# Altium schematic symbol library Connector.SchLib: 372 symbols (part 2 of 4) (continued)
## Conn_01x52_Socket (continued)
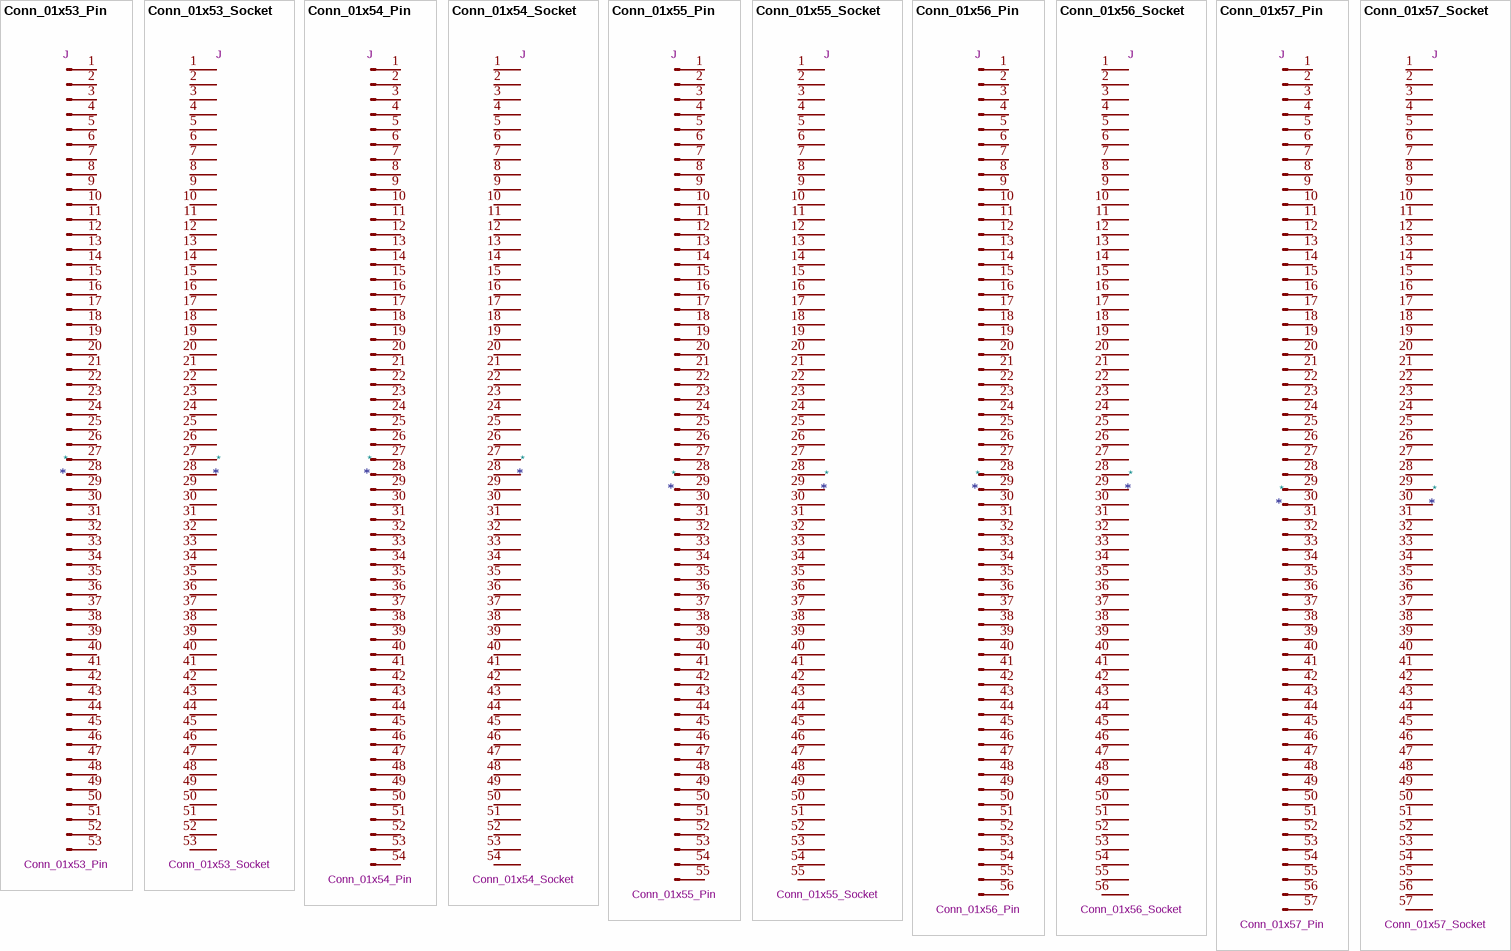
[diagram p7: symbols Conn_01x53_Pin to Conn_01x57_Socket]

## Conn_01x53_Pin
designator *  value Conn_01x53_Pin  Reference: J
ki_keywords: connector; ki_description: "Generic connector, single row, 01x53, script generated"; ki_fp_filters: Connector*:*_1x??_*; Datasheet: ~
pins: 1 Pin_1, 2 Pin_2, 3 Pin_3, 4 Pin_4, 5 Pin_5, 6 Pin_6, 7 Pin_7, 8 Pin_8, 9 Pin_9, 10 Pin_10, 11 Pin_11, 12 Pin_12, 13 Pin_13, 14 Pin_14, 15 Pin_15, 16 Pin_16, 17 Pin_17, 18 Pin_18, 19 Pin_19, 20 Pin_20, 21 Pin_21, 22 Pin_22, 23 Pin_23, 24 Pin_24, 25 Pin_25, 26 Pin_26, 27 Pin_27, 28 Pin_28, 29 Pin_29, 30 Pin_30, 31 Pin_31, 32 Pin_32, 33 Pin_33, 34 Pin_34, 35 Pin_35, 36 Pin_36, 37 Pin_37, 38 Pin_38, 39 Pin_39, 40 Pin_40, 41 Pin_41, 42 Pin_42, 43 Pin_43, 44 Pin_44, 45 Pin_45, 46 Pin_46, 47 Pin_47, 48 Pin_48, 49 Pin_49, 50 Pin_50, 51 Pin_51, 52 Pin_52, 53 Pin_53

## Conn_01x53_Socket
designator *  value Conn_01x53_Socket  Reference: J
ki_keywords: connector; ki_description: "Generic connector, single row, 01x53, script generated"; ki_fp_filters: Connector*:*_1x??_*; Datasheet: ~
pins: 1 Pin_1, 2 Pin_2, 3 Pin_3, 4 Pin_4, 5 Pin_5, 6 Pin_6, 7 Pin_7, 8 Pin_8, 9 Pin_9, 10 Pin_10, 11 Pin_11, 12 Pin_12, 13 Pin_13, 14 Pin_14, 15 Pin_15, 16 Pin_16, 17 Pin_17, 18 Pin_18, 19 Pin_19, 20 Pin_20, 21 Pin_21, 22 Pin_22, 23 Pin_23, 24 Pin_24, 25 Pin_25, 26 Pin_26, 27 Pin_27, 28 Pin_28, 29 Pin_29, 30 Pin_30, 31 Pin_31, 32 Pin_32, 33 Pin_33, 34 Pin_34, 35 Pin_35, 36 Pin_36, 37 Pin_37, 38 Pin_38, 39 Pin_39, 40 Pin_40, 41 Pin_41, 42 Pin_42, 43 Pin_43, 44 Pin_44, 45 Pin_45, 46 Pin_46, 47 Pin_47, 48 Pin_48, 49 Pin_49, 50 Pin_50, 51 Pin_51, 52 Pin_52, 53 Pin_53

## Conn_01x54_Pin
designator *  value Conn_01x54_Pin  Reference: J
ki_keywords: connector; ki_description: "Generic connector, single row, 01x54, script generated"; ki_fp_filters: Connector*:*_1x??_*; Datasheet: ~
pins: 1 Pin_1, 2 Pin_2, 3 Pin_3, 4 Pin_4, 5 Pin_5, 6 Pin_6, 7 Pin_7, 8 Pin_8, 9 Pin_9, 10 Pin_10, 11 Pin_11, 12 Pin_12, 13 Pin_13, 14 Pin_14, 15 Pin_15, 16 Pin_16, 17 Pin_17, 18 Pin_18, 19 Pin_19, 20 Pin_20, 21 Pin_21, 22 Pin_22, 23 Pin_23, 24 Pin_24, 25 Pin_25, 26 Pin_26, 27 Pin_27, 28 Pin_28, 29 Pin_29, 30 Pin_30, 31 Pin_31, 32 Pin_32, 33 Pin_33, 34 Pin_34, 35 Pin_35, 36 Pin_36, 37 Pin_37, 38 Pin_38, 39 Pin_39, 40 Pin_40, 41 Pin_41, 42 Pin_42, 43 Pin_43, 44 Pin_44, 45 Pin_45, 46 Pin_46, 47 Pin_47, 48 Pin_48, 49 Pin_49, 50 Pin_50, 51 Pin_51, 52 Pin_52, 53 Pin_53, 54 Pin_54

## Conn_01x54_Socket
designator *  value Conn_01x54_Socket  Reference: J
ki_keywords: connector; ki_description: "Generic connector, single row, 01x54, script generated"; ki_fp_filters: Connector*:*_1x??_*; Datasheet: ~
pins: 1 Pin_1, 2 Pin_2, 3 Pin_3, 4 Pin_4, 5 Pin_5, 6 Pin_6, 7 Pin_7, 8 Pin_8, 9 Pin_9, 10 Pin_10, 11 Pin_11, 12 Pin_12, 13 Pin_13, 14 Pin_14, 15 Pin_15, 16 Pin_16, 17 Pin_17, 18 Pin_18, 19 Pin_19, 20 Pin_20, 21 Pin_21, 22 Pin_22, 23 Pin_23, 24 Pin_24, 25 Pin_25, 26 Pin_26, 27 Pin_27, 28 Pin_28, 29 Pin_29, 30 Pin_30, 31 Pin_31, 32 Pin_32, 33 Pin_33, 34 Pin_34, 35 Pin_35, 36 Pin_36, 37 Pin_37, 38 Pin_38, 39 Pin_39, 40 Pin_40, 41 Pin_41, 42 Pin_42, 43 Pin_43, 44 Pin_44, 45 Pin_45, 46 Pin_46, 47 Pin_47, 48 Pin_48, 49 Pin_49, 50 Pin_50, 51 Pin_51, 52 Pin_52, 53 Pin_53, 54 Pin_54

## Conn_01x55_Pin
designator *  value Conn_01x55_Pin  Reference: J
ki_keywords: connector; ki_description: "Generic connector, single row, 01x55, script generated"; ki_fp_filters: Connector*:*_1x??_*; Datasheet: ~
pins: 1 Pin_1, 2 Pin_2, 3 Pin_3, 4 Pin_4, 5 Pin_5, 6 Pin_6, 7 Pin_7, 8 Pin_8, 9 Pin_9, 10 Pin_10, 11 Pin_11, 12 Pin_12, 13 Pin_13, 14 Pin_14, 15 Pin_15, 16 Pin_16, 17 Pin_17, 18 Pin_18, 19 Pin_19, 20 Pin_20, 21 Pin_21, 22 Pin_22, 23 Pin_23, 24 Pin_24, 25 Pin_25, 26 Pin_26, 27 Pin_27, 28 Pin_28, 29 Pin_29, 30 Pin_30, 31 Pin_31, 32 Pin_32, 33 Pin_33, 34 Pin_34, 35 Pin_35, 36 Pin_36, 37 Pin_37, 38 Pin_38, 39 Pin_39, 40 Pin_40, 41 Pin_41, 42 Pin_42, 43 Pin_43, 44 Pin_44, 45 Pin_45, 46 Pin_46, 47 Pin_47, 48 Pin_48, 49 Pin_49, 50 Pin_50, 51 Pin_51, 52 Pin_52, 53 Pin_53, 54 Pin_54, 55 Pin_55

## Conn_01x55_Socket
designator *  value Conn_01x55_Socket  Reference: J
ki_keywords: connector; ki_description: "Generic connector, single row, 01x55, script generated"; ki_fp_filters: Connector*:*_1x??_*; Datasheet: ~
pins: 1 Pin_1, 2 Pin_2, 3 Pin_3, 4 Pin_4, 5 Pin_5, 6 Pin_6, 7 Pin_7, 8 Pin_8, 9 Pin_9, 10 Pin_10, 11 Pin_11, 12 Pin_12, 13 Pin_13, 14 Pin_14, 15 Pin_15, 16 Pin_16, 17 Pin_17, 18 Pin_18, 19 Pin_19, 20 Pin_20, 21 Pin_21, 22 Pin_22, 23 Pin_23, 24 Pin_24, 25 Pin_25, 26 Pin_26, 27 Pin_27, 28 Pin_28, 29 Pin_29, 30 Pin_30, 31 Pin_31, 32 Pin_32, 33 Pin_33, 34 Pin_34, 35 Pin_35, 36 Pin_36, 37 Pin_37, 38 Pin_38, 39 Pin_39, 40 Pin_40, 41 Pin_41, 42 Pin_42, 43 Pin_43, 44 Pin_44, 45 Pin_45, 46 Pin_46, 47 Pin_47, 48 Pin_48, 49 Pin_49, 50 Pin_50, 51 Pin_51, 52 Pin_52, 53 Pin_53, 54 Pin_54, 55 Pin_55

## Conn_01x56_Pin
designator *  value Conn_01x56_Pin  Reference: J
ki_keywords: connector; ki_description: "Generic connector, single row, 01x56, script generated"; ki_fp_filters: Connector*:*_1x??_*; Datasheet: ~
pins: 1 Pin_1, 2 Pin_2, 3 Pin_3, 4 Pin_4, 5 Pin_5, 6 Pin_6, 7 Pin_7, 8 Pin_8, 9 Pin_9, 10 Pin_10, 11 Pin_11, 12 Pin_12, 13 Pin_13, 14 Pin_14, 15 Pin_15, 16 Pin_16, 17 Pin_17, 18 Pin_18, 19 Pin_19, 20 Pin_20, 21 Pin_21, 22 Pin_22, 23 Pin_23, 24 Pin_24, 25 Pin_25, 26 Pin_26, 27 Pin_27, 28 Pin_28, 29 Pin_29, 30 Pin_30, 31 Pin_31, 32 Pin_32, 33 Pin_33, 34 Pin_34, 35 Pin_35, 36 Pin_36, 37 Pin_37, 38 Pin_38, 39 Pin_39, 40 Pin_40, 41 Pin_41, 42 Pin_42, 43 Pin_43, 44 Pin_44, 45 Pin_45, 46 Pin_46, 47 Pin_47, 48 Pin_48, 49 Pin_49, 50 Pin_50, 51 Pin_51, 52 Pin_52, 53 Pin_53, 54 Pin_54, 55 Pin_55, 56 Pin_56

## Conn_01x56_Socket
designator *  value Conn_01x56_Socket  Reference: J
ki_keywords: connector; ki_description: "Generic connector, single row, 01x56, script generated"; ki_fp_filters: Connector*:*_1x??_*; Datasheet: ~
pins: 1 Pin_1, 2 Pin_2, 3 Pin_3, 4 Pin_4, 5 Pin_5, 6 Pin_6, 7 Pin_7, 8 Pin_8, 9 Pin_9, 10 Pin_10, 11 Pin_11, 12 Pin_12, 13 Pin_13, 14 Pin_14, 15 Pin_15, 16 Pin_16, 17 Pin_17, 18 Pin_18, 19 Pin_19, 20 Pin_20, 21 Pin_21, 22 Pin_22, 23 Pin_23, 24 Pin_24, 25 Pin_25, 26 Pin_26, 27 Pin_27, 28 Pin_28, 29 Pin_29, 30 Pin_30, 31 Pin_31, 32 Pin_32, 33 Pin_33, 34 Pin_34, 35 Pin_35, 36 Pin_36, 37 Pin_37, 38 Pin_38, 39 Pin_39, 40 Pin_40, 41 Pin_41, 42 Pin_42, 43 Pin_43, 44 Pin_44, 45 Pin_45, 46 Pin_46, 47 Pin_47, 48 Pin_48, 49 Pin_49, 50 Pin_50, 51 Pin_51, 52 Pin_52, 53 Pin_53, 54 Pin_54, 55 Pin_55, 56 Pin_56

## Conn_01x57_Pin
designator *  value Conn_01x57_Pin  Reference: J
ki_keywords: connector; ki_description: "Generic connector, single row, 01x57, script generated"; ki_fp_filters: Connector*:*_1x??_*; Datasheet: ~
pins: 1 Pin_1, 2 Pin_2, 3 Pin_3, 4 Pin_4, 5 Pin_5, 6 Pin_6, 7 Pin_7, 8 Pin_8, 9 Pin_9, 10 Pin_10, 11 Pin_11, 12 Pin_12, 13 Pin_13, 14 Pin_14, 15 Pin_15, 16 Pin_16, 17 Pin_17, 18 Pin_18, 19 Pin_19, 20 Pin_20, 21 Pin_21, 22 Pin_22, 23 Pin_23, 24 Pin_24, 25 Pin_25, 26 Pin_26, 27 Pin_27, 28 Pin_28, 29 Pin_29, 30 Pin_30, 31 Pin_31, 32 Pin_32, 33 Pin_33, 34 Pin_34, 35 Pin_35, 36 Pin_36, 37 Pin_37, 38 Pin_38, 39 Pin_39, 40 Pin_40, 41 Pin_41, 42 Pin_42, 43 Pin_43, 44 Pin_44, 45 Pin_45, 46 Pin_46, 47 Pin_47, 48 Pin_48, 49 Pin_49, 50 Pin_50, 51 Pin_51, 52 Pin_52, 53 Pin_53, 54 Pin_54, 55 Pin_55, 56 Pin_56, 57 Pin_57

## Conn_01x57_Socket
designator *  value Conn_01x57_Socket  Reference: J
ki_keywords: connector; ki_description: "Generic connector, single row, 01x57, script generated"; ki_fp_filters: Connector*:*_1x??_*; Datasheet: ~
pins: 1 Pin_1, 2 Pin_2, 3 Pin_3, 4 Pin_4, 5 Pin_5, 6 Pin_6, 7 Pin_7, 8 Pin_8, 9 Pin_9, 10 Pin_10, 11 Pin_11, 12 Pin_12, 13 Pin_13, 14 Pin_14, 15 Pin_15, 16 Pin_16, 17 Pin_17, 18 Pin_18, 19 Pin_19, 20 Pin_20, 21 Pin_21, 22 Pin_22, 23 Pin_23, 24 Pin_24, 25 Pin_25, 26 Pin_26, 27 Pin_27, 28 Pin_28, 29 Pin_29, 30 Pin_30, 31 Pin_31, 32 Pin_32, 33 Pin_33, 34 Pin_34, 35 Pin_35, 36 Pin_36, 37 Pin_37, 38 Pin_38, 39 Pin_39, 40 Pin_40, 41 Pin_41, 42 Pin_42, 43 Pin_43, 44 Pin_44, 45 Pin_45, 46 Pin_46, 47 Pin_47, 48 Pin_48, 49 Pin_49, 50 Pin_50, 51 Pin_51, 52 Pin_52, 53 Pin_53, 54 Pin_54, 55 Pin_55, 56 Pin_56, 57 Pin_57

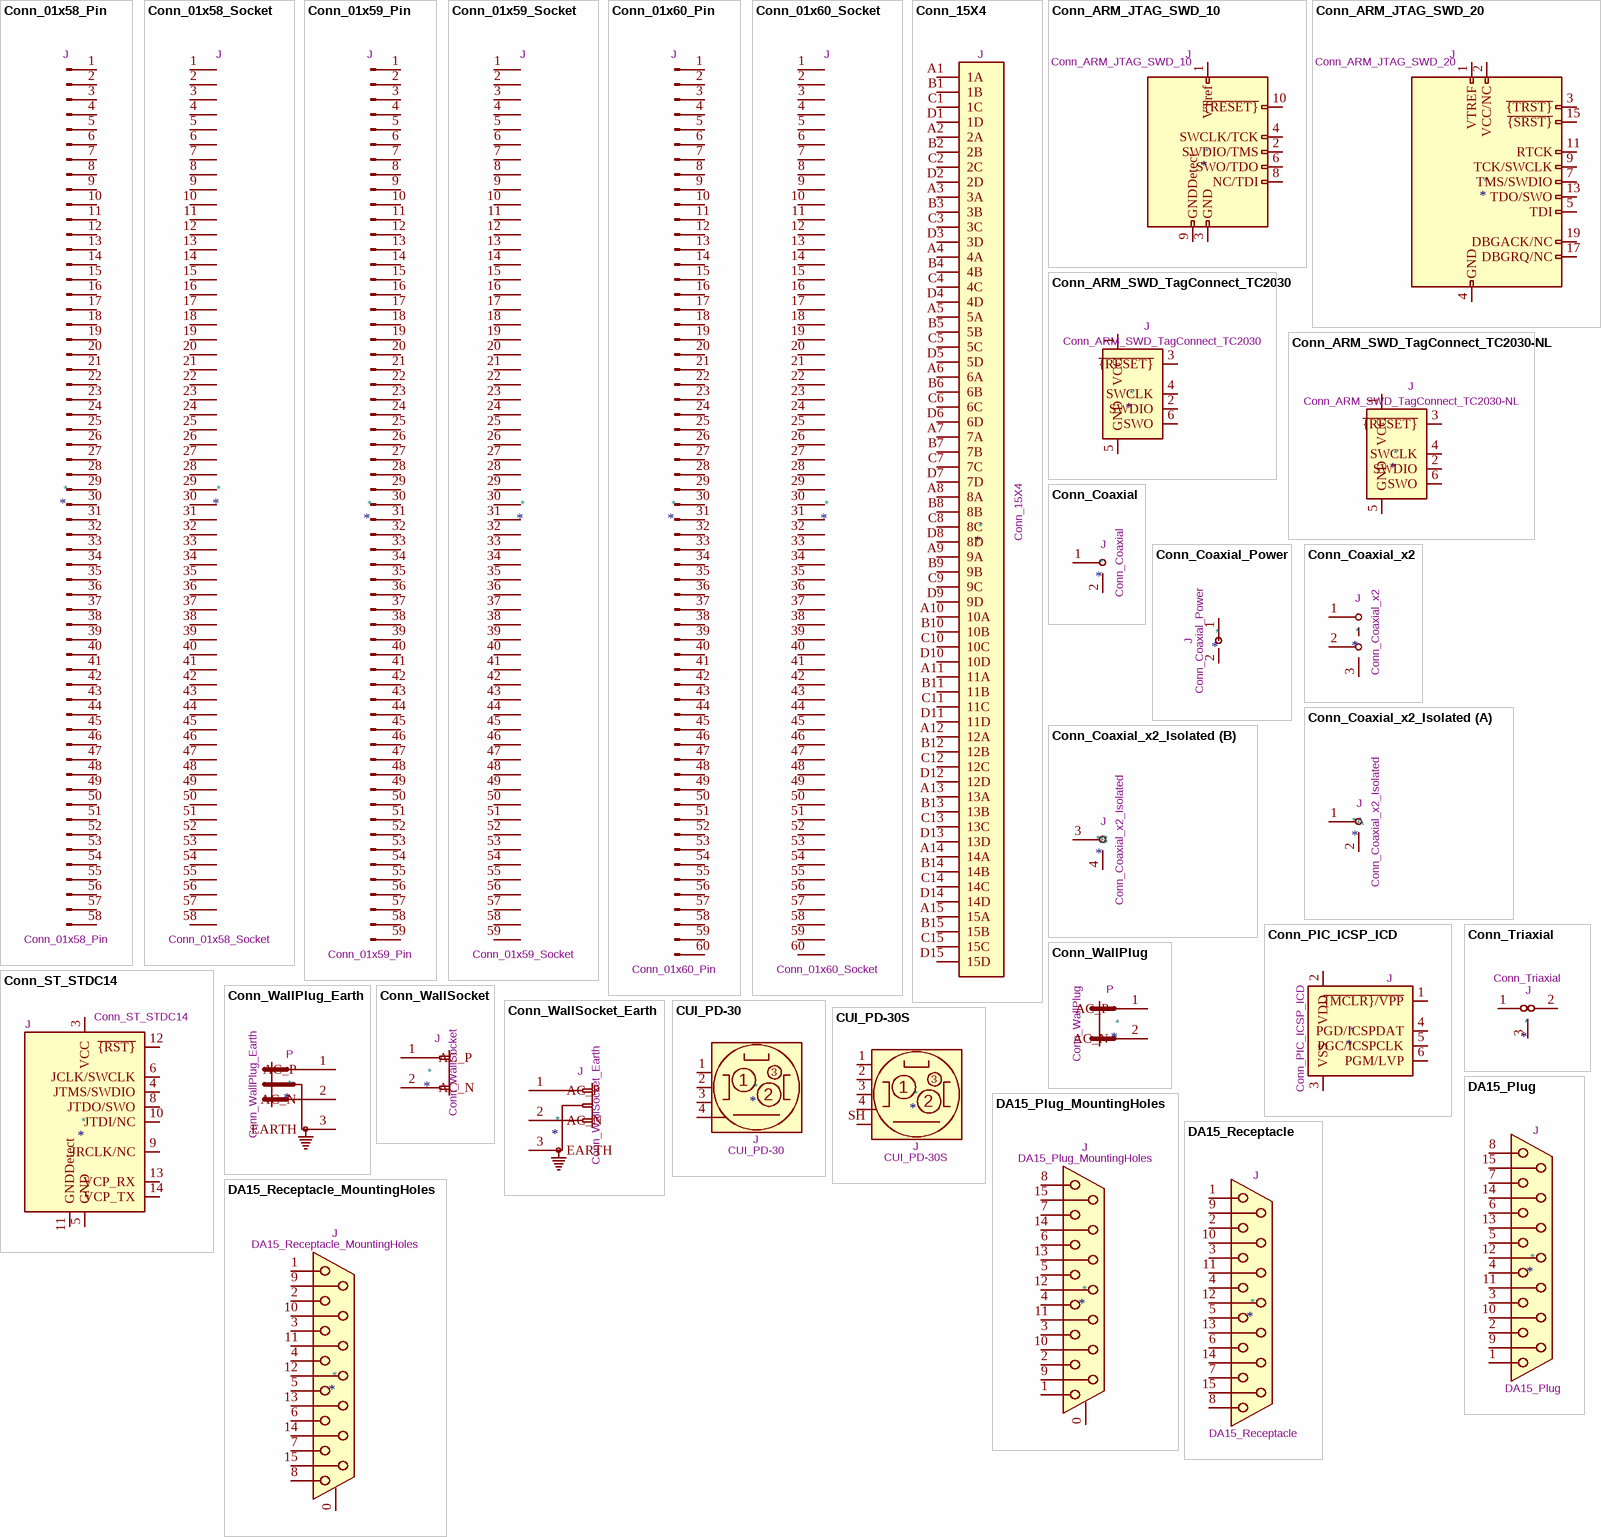
[diagram p8: symbols Conn_01x58_Pin to DA15_Receptacle_MountingHoles]

## Conn_01x58_Pin
designator *  value Conn_01x58_Pin  Reference: J
ki_keywords: connector; ki_description: "Generic connector, single row, 01x58, script generated"; ki_fp_filters: Connector*:*_1x??_*; Datasheet: ~
pins: 1 Pin_1, 2 Pin_2, 3 Pin_3, 4 Pin_4, 5 Pin_5, 6 Pin_6, 7 Pin_7, 8 Pin_8, 9 Pin_9, 10 Pin_10, 11 Pin_11, 12 Pin_12, 13 Pin_13, 14 Pin_14, 15 Pin_15, 16 Pin_16, 17 Pin_17, 18 Pin_18, 19 Pin_19, 20 Pin_20, 21 Pin_21, 22 Pin_22, 23 Pin_23, 24 Pin_24, 25 Pin_25, 26 Pin_26, 27 Pin_27, 28 Pin_28, 29 Pin_29, 30 Pin_30, 31 Pin_31, 32 Pin_32, 33 Pin_33, 34 Pin_34, 35 Pin_35, 36 Pin_36, 37 Pin_37, 38 Pin_38, 39 Pin_39, 40 Pin_40, 41 Pin_41, 42 Pin_42, 43 Pin_43, 44 Pin_44, 45 Pin_45, 46 Pin_46, 47 Pin_47, 48 Pin_48, 49 Pin_49, 50 Pin_50, 51 Pin_51, 52 Pin_52, 53 Pin_53, 54 Pin_54, 55 Pin_55, 56 Pin_56, 57 Pin_57, 58 Pin_58

## Conn_01x58_Socket
designator *  value Conn_01x58_Socket  Reference: J
ki_keywords: connector; ki_description: "Generic connector, single row, 01x58, script generated"; ki_fp_filters: Connector*:*_1x??_*; Datasheet: ~
pins: 1 Pin_1, 2 Pin_2, 3 Pin_3, 4 Pin_4, 5 Pin_5, 6 Pin_6, 7 Pin_7, 8 Pin_8, 9 Pin_9, 10 Pin_10, 11 Pin_11, 12 Pin_12, 13 Pin_13, 14 Pin_14, 15 Pin_15, 16 Pin_16, 17 Pin_17, 18 Pin_18, 19 Pin_19, 20 Pin_20, 21 Pin_21, 22 Pin_22, 23 Pin_23, 24 Pin_24, 25 Pin_25, 26 Pin_26, 27 Pin_27, 28 Pin_28, 29 Pin_29, 30 Pin_30, 31 Pin_31, 32 Pin_32, 33 Pin_33, 34 Pin_34, 35 Pin_35, 36 Pin_36, 37 Pin_37, 38 Pin_38, 39 Pin_39, 40 Pin_40, 41 Pin_41, 42 Pin_42, 43 Pin_43, 44 Pin_44, 45 Pin_45, 46 Pin_46, 47 Pin_47, 48 Pin_48, 49 Pin_49, 50 Pin_50, 51 Pin_51, 52 Pin_52, 53 Pin_53, 54 Pin_54, 55 Pin_55, 56 Pin_56, 57 Pin_57, 58 Pin_58

## Conn_01x59_Pin
designator *  value Conn_01x59_Pin  Reference: J
ki_keywords: connector; ki_description: "Generic connector, single row, 01x59, script generated"; ki_fp_filters: Connector*:*_1x??_*; Datasheet: ~
pins: 1 Pin_1, 2 Pin_2, 3 Pin_3, 4 Pin_4, 5 Pin_5, 6 Pin_6, 7 Pin_7, 8 Pin_8, 9 Pin_9, 10 Pin_10, 11 Pin_11, 12 Pin_12, 13 Pin_13, 14 Pin_14, 15 Pin_15, 16 Pin_16, 17 Pin_17, 18 Pin_18, 19 Pin_19, 20 Pin_20, 21 Pin_21, 22 Pin_22, 23 Pin_23, 24 Pin_24, 25 Pin_25, 26 Pin_26, 27 Pin_27, 28 Pin_28, 29 Pin_29, 30 Pin_30, 31 Pin_31, 32 Pin_32, 33 Pin_33, 34 Pin_34, 35 Pin_35, 36 Pin_36, 37 Pin_37, 38 Pin_38, 39 Pin_39, 40 Pin_40, 41 Pin_41, 42 Pin_42, 43 Pin_43, 44 Pin_44, 45 Pin_45, 46 Pin_46, 47 Pin_47, 48 Pin_48, 49 Pin_49, 50 Pin_50, 51 Pin_51, 52 Pin_52, 53 Pin_53, 54 Pin_54, 55 Pin_55, 56 Pin_56, 57 Pin_57, 58 Pin_58, 59 Pin_59

## Conn_01x59_Socket
designator *  value Conn_01x59_Socket  Reference: J
ki_keywords: connector; ki_description: "Generic connector, single row, 01x59, script generated"; ki_fp_filters: Connector*:*_1x??_*; Datasheet: ~
pins: 1 Pin_1, 2 Pin_2, 3 Pin_3, 4 Pin_4, 5 Pin_5, 6 Pin_6, 7 Pin_7, 8 Pin_8, 9 Pin_9, 10 Pin_10, 11 Pin_11, 12 Pin_12, 13 Pin_13, 14 Pin_14, 15 Pin_15, 16 Pin_16, 17 Pin_17, 18 Pin_18, 19 Pin_19, 20 Pin_20, 21 Pin_21, 22 Pin_22, 23 Pin_23, 24 Pin_24, 25 Pin_25, 26 Pin_26, 27 Pin_27, 28 Pin_28, 29 Pin_29, 30 Pin_30, 31 Pin_31, 32 Pin_32, 33 Pin_33, 34 Pin_34, 35 Pin_35, 36 Pin_36, 37 Pin_37, 38 Pin_38, 39 Pin_39, 40 Pin_40, 41 Pin_41, 42 Pin_42, 43 Pin_43, 44 Pin_44, 45 Pin_45, 46 Pin_46, 47 Pin_47, 48 Pin_48, 49 Pin_49, 50 Pin_50, 51 Pin_51, 52 Pin_52, 53 Pin_53, 54 Pin_54, 55 Pin_55, 56 Pin_56, 57 Pin_57, 58 Pin_58, 59 Pin_59

## Conn_01x60_Pin
designator *  value Conn_01x60_Pin  Reference: J
ki_keywords: connector; ki_description: "Generic connector, single row, 01x60, script generated"; ki_fp_filters: Connector*:*_1x??_*; Datasheet: ~
pins: 1 Pin_1, 2 Pin_2, 3 Pin_3, 4 Pin_4, 5 Pin_5, 6 Pin_6, 7 Pin_7, 8 Pin_8, 9 Pin_9, 10 Pin_10, 11 Pin_11, 12 Pin_12, 13 Pin_13, 14 Pin_14, 15 Pin_15, 16 Pin_16, 17 Pin_17, 18 Pin_18, 19 Pin_19, 20 Pin_20, 21 Pin_21, 22 Pin_22, 23 Pin_23, 24 Pin_24, 25 Pin_25, 26 Pin_26, 27 Pin_27, 28 Pin_28, 29 Pin_29, 30 Pin_30, 31 Pin_31, 32 Pin_32, 33 Pin_33, 34 Pin_34, 35 Pin_35, 36 Pin_36, 37 Pin_37, 38 Pin_38, 39 Pin_39, 40 Pin_40, 41 Pin_41, 42 Pin_42, 43 Pin_43, 44 Pin_44, 45 Pin_45, 46 Pin_46, 47 Pin_47, 48 Pin_48, 49 Pin_49, 50 Pin_50, 51 Pin_51, 52 Pin_52, 53 Pin_53, 54 Pin_54, 55 Pin_55, 56 Pin_56, 57 Pin_57, 58 Pin_58, 59 Pin_59, 60 Pin_60

## Conn_01x60_Socket
designator *  value Conn_01x60_Socket  Reference: J
ki_keywords: connector; ki_description: "Generic connector, single row, 01x60, script generated"; ki_fp_filters: Connector*:*_1x??_*; Datasheet: ~
pins: 1 Pin_1, 2 Pin_2, 3 Pin_3, 4 Pin_4, 5 Pin_5, 6 Pin_6, 7 Pin_7, 8 Pin_8, 9 Pin_9, 10 Pin_10, 11 Pin_11, 12 Pin_12, 13 Pin_13, 14 Pin_14, 15 Pin_15, 16 Pin_16, 17 Pin_17, 18 Pin_18, 19 Pin_19, 20 Pin_20, 21 Pin_21, 22 Pin_22, 23 Pin_23, 24 Pin_24, 25 Pin_25, 26 Pin_26, 27 Pin_27, 28 Pin_28, 29 Pin_29, 30 Pin_30, 31 Pin_31, 32 Pin_32, 33 Pin_33, 34 Pin_34, 35 Pin_35, 36 Pin_36, 37 Pin_37, 38 Pin_38, 39 Pin_39, 40 Pin_40, 41 Pin_41, 42 Pin_42, 43 Pin_43, 44 Pin_44, 45 Pin_45, 46 Pin_46, 47 Pin_47, 48 Pin_48, 49 Pin_49, 50 Pin_50, 51 Pin_51, 52 Pin_52, 53 Pin_53, 54 Pin_54, 55 Pin_55, 56 Pin_56, 57 Pin_57, 58 Pin_58, 59 Pin_59, 60 Pin_60

## Conn_15X4
designator *  value Conn_15X4  Reference: J
ki_keywords: connector; ki_description: Connector Europe, 60 contacts, ranges A,B,C,D; Datasheet: ~
pins: A1 1A, A2 2A, A3 3A, A4 4A, A5 5A, A6 6A, A7 7A, A8 8A, A9 9A, A10 10A, A11 11A, A12 12A, A13 13A, A14 14A, A15 15A, B1 1B, B2 2B, B3 3B, B4 4B, B5 5B, B6 6B, B7 7B, B8 8B, B9 9B, B10 10B, B11 11B, B12 12B, B13 13B, B14 14B, B15 15B, C1 1C, C2 2C, C3 3C, C4 4C, C5 5C, C6 6C, C7 7C, C8 8C, C9 9C, C10 10C, C11 11C, C12 12C, C13 13C, C14 14C, C15 15C, D1 1D, D2 2D, D3 3D, D4 4D, D5 5D, D6 6D, D7 7D, D8 8D, D9 9D, D10 10D, D11 11D, D12 12D, D13 13D, D14 14D, D15 15D

## Conn_ARM_JTAG_SWD_10
designator *  value Conn_ARM_JTAG_SWD_10  Reference: J
ki_keywords: Cortex Debug Connector ARM SWD JTAG; ki_description: Cortex Debug Connector, standard ARM Cortex-M SWD and JTAG interface; ki_fp_filters: PinHeader?2x05?P1.27mm*; Datasheet: http://infocenter.arm.com/help/topic/com.arm.doc.ddi0314h/DDI0314H_coresight_components_trm.pdf
pins: 1 VTref, 2 SWDIO/TMS, 3 GND, 4 SWCLK/TCK, 5 GND hidden, 6 SWO/TDO, 7 KEY hidden, 8 NC/TDI, 9 GNDDetect, 10 ~{{RESET}}

## Conn_ARM_JTAG_SWD_20
designator *  value Conn_ARM_JTAG_SWD_20  Reference: J
ki_keywords: IDC20 Pinheader Pins Connector ARM JTAG SWD; ki_description: Standard IDC20 Pinheader Connector, ARM legacy JTAG and SWD interface; ki_fp_filters: IDC*Header*P2.54mm* PinHeader*2x10*P2.54mm*; Datasheet: http://infocenter.arm.com/help/topic/com.arm.doc.dui0499b/DUI0499B_system_design_reference.pdf
pins: 1 VTREF, 2 VCC/NC, 3 ~{{TRST}}, 4 GND, 5 TDI, 6 GND hidden, 7 TMS/SWDIO, 8 GND hidden, 9 TCK/SWCLK, 10 GND hidden, 11 RTCK, 12 GND hidden, 13 TDO/SWO, 14 GND hidden, 15 ~{{SRST}}, 16 GND hidden, 17 DBGRQ/NC, 18 GND hidden, 19 DBGACK/NC, 20 GND hidden

## Conn_ARM_SWD_TagConnect_TC2030
designator *  value Conn_ARM_SWD_TagConnect_TC2030  Reference: J
ki_keywords: Cortex Debug Connector ARM SWD JTAG; ki_description: Tag-Connect ARM Cortex SWD JTAG connector, 6 pin; ki_fp_filters: *TC2030*; Footprint: Connector:Tag-Connect_TC2030-IDC-FP_2x03_P1.27mm_Vertical; Datasheet: https://www.tag-connect.com/wp-content/uploads/bsk-pdf-manager/TC2030-CTX_1.pdf
pins: 1 VCC, 2 SWDIO, 3 ~{{RESET}}, 4 SWCLK, 5 GND, 6 SWO

## Conn_ARM_SWD_TagConnect_TC2030-NL
designator *  value Conn_ARM_SWD_TagConnect_TC2030-NL  Reference: J
ki_keywords: Cortex Debug Connector ARM SWD JTAG; ki_description: Tag-Connect ARM Cortex SWD JTAG connector, 6 pin, no legs; ki_fp_filters: *TC2030*; Footprint: Connector:Tag-Connect_TC2030-IDC-NL_2x03_P1.27mm_Vertical; Datasheet: https://www.tag-connect.com/wp-content/uploads/bsk-pdf-manager/TC2030-CTX_1.pdf
pins: 1 VCC, 2 SWDIO, 3 ~{{RESET}}, 4 SWCLK, 5 GND, 6 SWO

## Conn_Coaxial
designator *  value Conn_Coaxial  Reference: J
ki_keywords: BNC SMA SMB SMC LEMO coaxial connector CINCH RCA MCX MMCX U.FL UMRF; ki_description: coaxial connector (BNC, SMA, SMB, SMC, Cinch/RCA, LEMO, ...); ki_fp_filters: *BNC* *SMA* *SMB* *SMC* *Cinch* *LEMO* *UMRF* *MCX* *U.FL*; Datasheet: ~
pins: 1 In, 2 Ext

## Conn_Coaxial_Power
designator *  value Conn_Coaxial_Power  Reference: J
ki_keywords: BNC SMA SMB SMC LEMO coaxial connector CINCH RCA; ki_description: coaxial connector (BNC, SMA, SMB, SMC, Cinch/RCA, LEMO, ...); ki_fp_filters: *BNC* *SMA* *SMB* *SMC* *Cinch* *LEMO*; Datasheet: ~
pins: 1 In, 2 Ext

## Conn_Coaxial_x2
designator *  value Conn_Coaxial_x2  Reference: J
ki_keywords: BNC SMA SMB SMC LEMO coaxial connector CINCH RCA; ki_description: double coaxial connector (BNC, SMA, SMB, SMC, Cinch/RCA, LEMO, ...); ki_fp_filters: *BNC* *SMA* *SMB* *SMC* *Cinch* *LEMO*; Datasheet: ~
pins: 1 IN1, 2 IN2, 3 EXT

## Conn_Coaxial_x2_Isolated
designator *  value Conn_Coaxial_x2_Isolated  Reference: J
ki_keywords: BNC SMA SMB SMC LEMO coaxial connector CINCH RCA; ki_description: coaxial connector (BNC, SMA, SMB, SMC, Cinch/RCA, LEMO, ...); ki_fp_filters: *BNC* *SMA* *SMB* *SMC* *Cinch* *LEMO*; Datasheet: ~
part A pins: 1 In1, 2 Ext1
part B pins: 3 In2, 4 Ext2

## Conn_PIC_ICSP_ICD
designator *  value Conn_PIC_ICSP_ICD  Reference: J
ki_keywords: icsp icd pic microchip; ki_description: Microchip PIC In-Circuit Serial Programming/Debugging (ICSP/ICD) connector; ki_fp_filters: PinHeader*1x06*P2.54mm* PinSocket*1x06*P2.54mm*; Datasheet: http://ww1.microchip.com/downloads/en/devicedoc/30277d.pdf
pins: 1 ~{{MCLR}/VPP}, 2 VDD, 3 VSS, 4 PGD/ICSPDAT, 5 PGC/ICSPCLK, 6 PGM/LVP

## Conn_ST_STDC14
designator *  value Conn_ST_STDC14  Reference: J
ki_keywords: ST STM32 Cortex Debug Connector ARM SWD JTAG; ki_description: ST Debug Connector, standard ARM Cortex-M SWD and JTAG interface plus UART; ki_fp_filters: PinHeader?2x07?P1.27mm*; Datasheet: https://www.st.com/content/ccc/resource/technical/document/user_manual/group1/99/49/91/b6/b2/3a/46/e5/DM00526767/files/DM00526767.pdf/jcr:content/translations/en.DM00526767.pdf
pins: 1 NC hidden, 2 NC hidden, 3 VCC, 4 JTMS/SWDIO, 5 GND, 6 JCLK/SWCLK, 7 GND hidden, 8 JTDO/SWO, 9 JRCLK/NC, 10 JTDI/NC, 11 GNDDetect, 12 ~{{RST}}, 13 VCP_RX, 14 VCP_TX

## Conn_Triaxial
designator *  value Conn_Triaxial  Reference: J
ki_keywords: LEMO triaxial connector differential LVDS; ki_description: triaxial connector (LEMO 00.302, ...); ki_fp_filters: *LEMO*; Datasheet: ~
pins: 1 In1, 2 In2, 3 Ext

## Conn_WallPlug
designator *  value Conn_WallPlug  Reference: P
ki_keywords: wall plug 110VAC 220VAC; ki_description: 3-pin general wall plug, no Earth wire (110VAC, 220VAC); Datasheet: ~
pins: 1 AC_P, 2 AC_N

## Conn_WallPlug_Earth
designator *  value Conn_WallPlug_Earth  Reference: P
ki_keywords: wall plug 110VAC 220VAC; ki_description: 3-pin general wall plug, with Earth wire (110VAC, 220VAC); Datasheet: ~
pins: 1 AC_P, 2 AC_N, 3 EARTH

## Conn_WallSocket
designator *  value Conn_WallSocket  Reference: J
ki_keywords: wall socket 110VAC 220VAC; ki_description: 3-pin german wall socket, no Earth wire (110VAC, 220VAC); Datasheet: ~
pins: 1 AC_P, 2 AC_N

## Conn_WallSocket_Earth
designator *  value Conn_WallSocket_Earth  Reference: J
ki_keywords: wall socket 110VAC 220VAC; ki_description: 3-pin german wall socket, with Earth wire (110VAC, 220VAC); Datasheet: ~
pins: 1 AC_P, 2 AC_N, 3 EARTH

## CUI_PD-30
designator *  value CUI_PD-30  Reference: J
ki_keywords: connector 3-pin PD-30 power DIN; ki_description: 3 pin connector, PD-30; ki_fp_filters: CUI*PD*30*; Footprint: Connector:CUI_PD-30; Datasheet: http://www.cui.com/product/resource/pd-30.pdf
pins: 1, 2, 3, 4 Shield

## CUI_PD-30S
designator *  value CUI_PD-30S  Reference: J
ki_keywords: connector 3-pin PD-30S power DIN; ki_description: 3 pin connector, PD-30S; ki_fp_filters: CUI*PD*30S*; Footprint: Connector:CUI_PD-30S; Datasheet: http://www.cui.com/product/resource/pd-30.pdf
pins: 1, 2, 3, 4 Shield, SH Shield

## DA15_Plug
designator *  value DA15_Plug  Reference: J
ki_keywords: male plug D-SUB connector; ki_description: 15-pin male plug pin D-SUB connector (low-density/2 columns); ki_fp_filters: DSUB*Male*; Datasheet: ~
pins: 1, 2, 3, 4, 5, 6, 7, 8, 9 P9, 10 P10, 11 P111, 12 P12, 13 P13, 14 P14, 15 P15

## DA15_Plug_MountingHoles
designator *  value DA15_Plug_MountingHoles  Reference: J
ki_keywords: male plug D-SUB connector; ki_description: 15-pin male plug pin D-SUB connector (low-density/2 columns), Mounting Hole; ki_fp_filters: DSUB*Male*; Datasheet: ~
pins: 0 PAD, 1, 2, 3, 4, 5, 6, 7, 8, 9 P9, 10 P10, 11 P111, 12 P12, 13 P13, 14 P14, 15 P15

## DA15_Receptacle
designator *  value DA15_Receptacle  Reference: J
ki_keywords: female receptacle D-SUB connector; ki_description: 15-pin female receptacle socket D-SUB connector (low-density/2 columns); ki_fp_filters: DSUB*Female*; Datasheet: ~
pins: 1, 2, 3, 4, 5, 6, 7, 8, 9 P9, 10 P10, 11 P111, 12 P12, 13 P13, 14 P14, 15 P15

## DA15_Receptacle_MountingHoles
designator *  value DA15_Receptacle_MountingHoles  Reference: J
ki_keywords: female receptacle D-SUB connector; ki_description: 15-pin female receptacle socket D-SUB connector (low-density/2 columns), Mounting Hole; ki_fp_filters: DSUB*Female*; Datasheet: ~
pins: 0 PAD, 1, 2, 3, 4, 5, 6, 7, 8, 9 P9, 10 P10, 11 P111, 12 P12, 13 P13, 14 P14, 15 P15

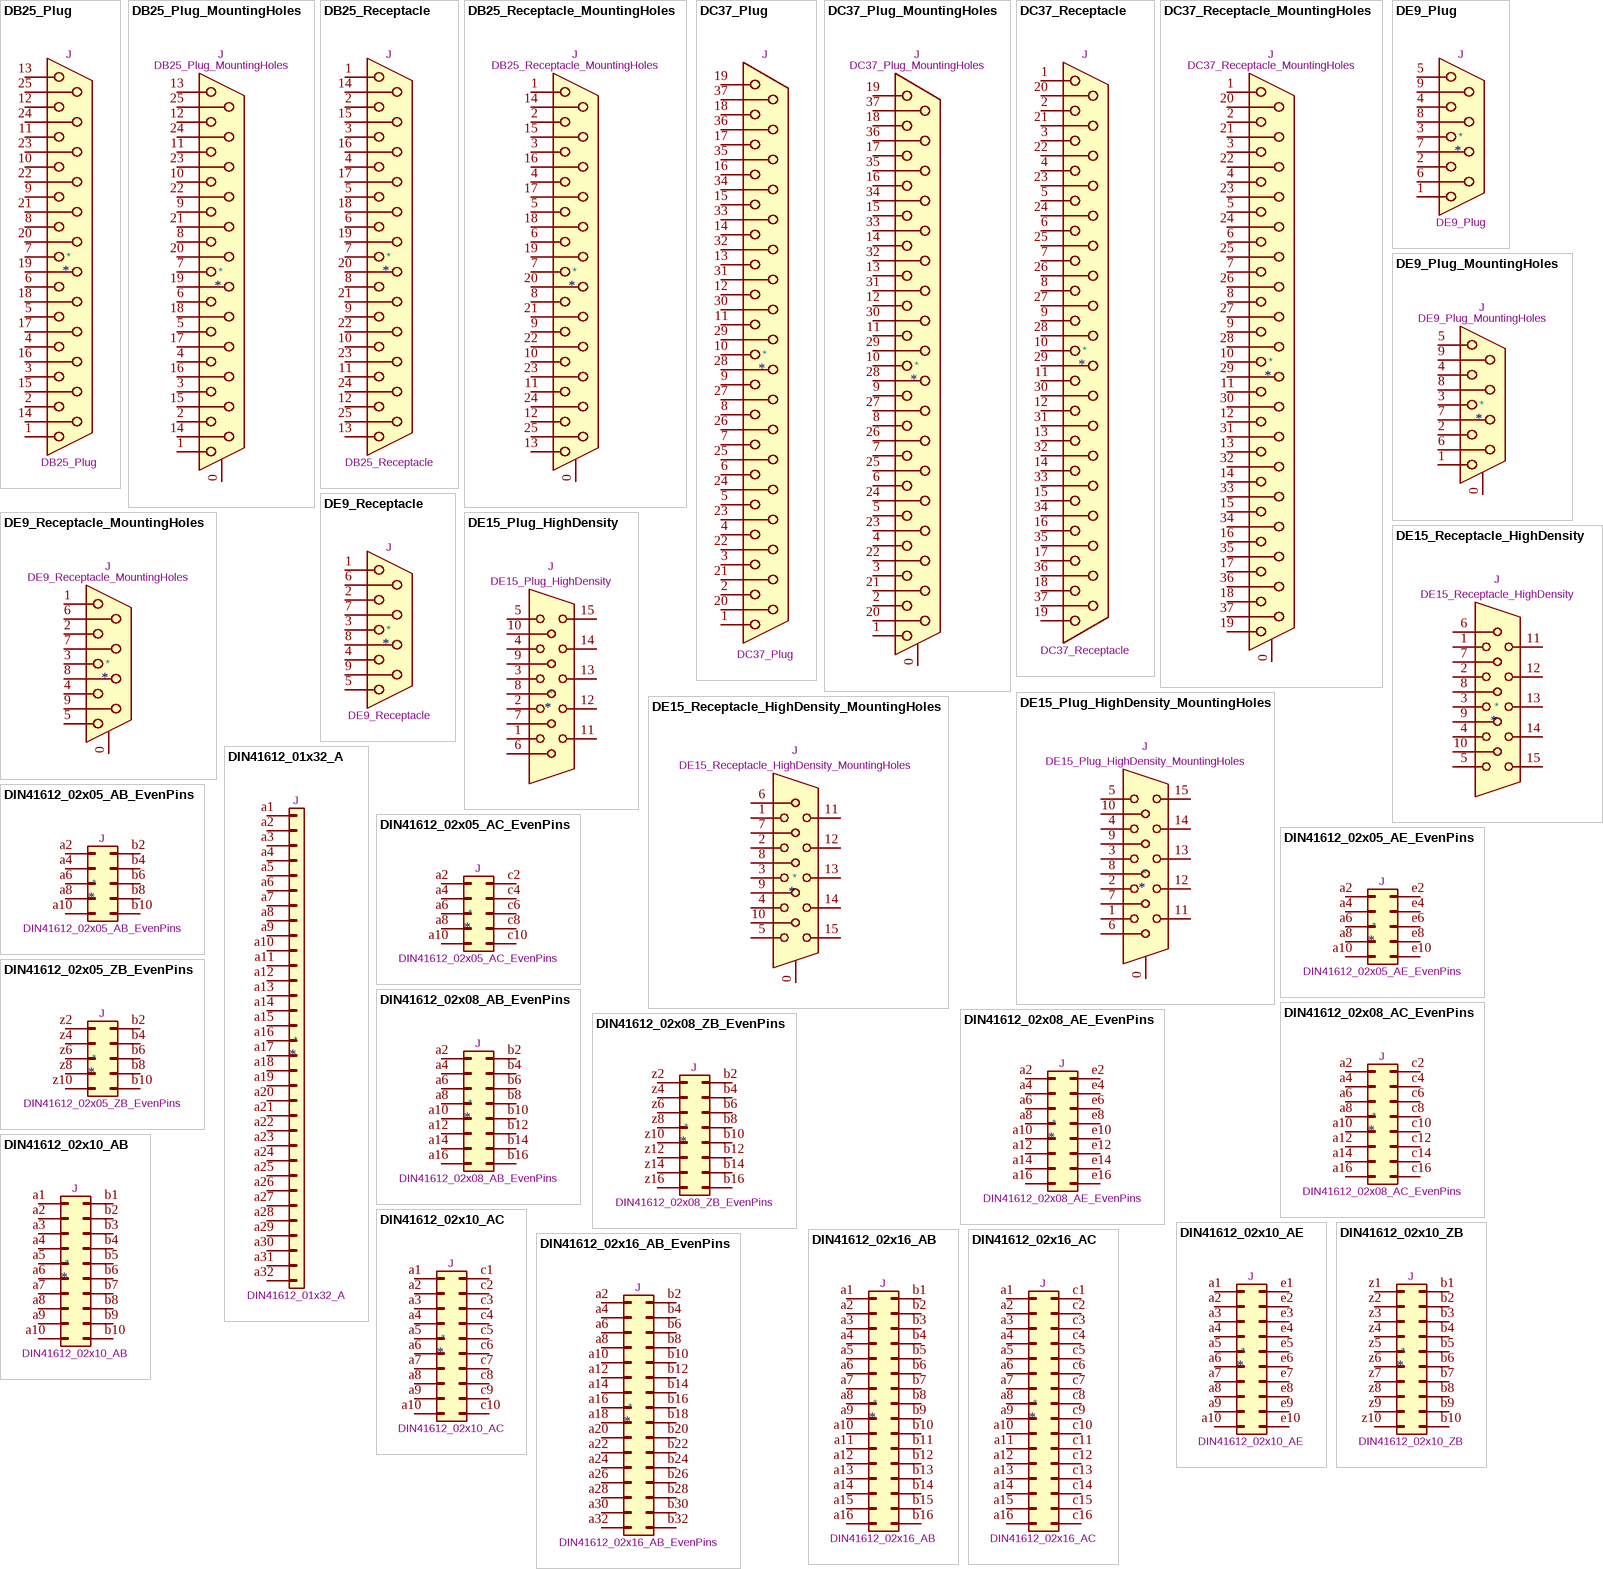
[diagram p9: symbols DB25_Plug to DIN41612_02x16_AC]

## DB25_Plug
designator *  value DB25_Plug  Reference: J
ki_keywords: male plug D-SUB connector; ki_description: 25-pin male plug pin D-SUB connector; ki_fp_filters: DSUB*Male*; Datasheet: ~
pins: 1, 2, 3, 4, 5, 6, 7, 8, 9, 10, 11, 12, 13, 14 P14, 15 P15, 16 P16, 17 P17, 18 P18, 19 P19, 20 P20, 21 P21, 22 P22, 23 P23, 24 P24, 25 P25

## DB25_Plug_MountingHoles
designator *  value DB25_Plug_MountingHoles  Reference: J
ki_keywords: male plug D-SUB connector; ki_description: 25-pin male plug pin D-SUB connector, Mounting Hole; ki_fp_filters: DSUB*Male*; Datasheet: ~
pins: 0 PAD, 1, 2, 3, 4, 5, 6, 7, 8, 9, 10, 11, 12, 13, 14 P14, 15 P15, 16 P16, 17 P17, 18 P18, 19 P19, 20 P20, 21 P21, 22 P22, 23 P23, 24 P24, 25 P25

## DB25_Receptacle
designator *  value DB25_Receptacle  Reference: J
ki_keywords: female receptacle D-SUB connector; ki_description: 25-pin female receptacle socket D-SUB connector; ki_fp_filters: DSUB*Female*; Datasheet: ~
pins: 1, 2, 3, 4, 5, 6, 7, 8, 9, 10, 11, 12, 13, 14 P14, 15 P15, 16 P16, 17 P17, 18 P18, 19 P19, 20 P20, 21 P21, 22 P22, 23 P23, 24 P24, 25 P25

## DB25_Receptacle_MountingHoles
designator *  value DB25_Receptacle_MountingHoles  Reference: J
ki_keywords: female receptacle D-SUB connector; ki_description: 25-pin female receptacle socket D-SUB connector, Mounting Hole; ki_fp_filters: DSUB*Female*; Datasheet: ~
pins: 0 PAD, 1, 2, 3, 4, 5, 6, 7, 8, 9, 10, 11, 12, 13, 14 P14, 15 P15, 16 P16, 17 P17, 18 P18, 19 P19, 20 P20, 21 P21, 22 P22, 23 P23, 24 P24, 25 P25

## DC37_Plug
designator *  value DC37_Plug  Reference: J
ki_keywords: male plug D-SUB connector; ki_description: 37-pin male plug pin D-SUB connector; ki_fp_filters: DSUB*Male*; Datasheet: ~
pins: 1, 2, 3, 4, 5, 6, 7, 8, 9, 10, 11, 12, 13, 14, 15, 16, 17, 18, 19, 20, 21, 22, 23, 24, 25, 26, 27, 28, 29, 30, 31, 32, 33, 34, 35, 36, 37

## DC37_Plug_MountingHoles
designator *  value DC37_Plug_MountingHoles  Reference: J
ki_keywords: male plug D-SUB connector; ki_description: 37-pin male plug pin D-SUB connector, Mounting Hole; ki_fp_filters: DSUB*Male*; Datasheet: ~
pins: 0 PAD, 1, 2, 3, 4, 5, 6, 7, 8, 9, 10, 11, 12, 13, 14, 15, 16, 17, 18, 19, 20, 21, 22, 23, 24, 25, 26, 27, 28, 29, 30, 31, 32, 33, 34, 35, 36, 37

## DC37_Receptacle
designator *  value DC37_Receptacle  Reference: J
ki_keywords: female receptacle D-SUB connector; ki_description: 37-pin female receptacle socket D-SUB connector; ki_fp_filters: DSUB*Female*; Datasheet: ~
pins: 1, 2, 3, 4, 5, 6, 7, 8, 9, 10, 11, 12, 13, 14, 15, 16, 17, 18, 19, 20, 21, 22, 23, 24, 25, 26, 27, 28, 29, 30, 31, 32, 33, 34, 35, 36, 37

## DC37_Receptacle_MountingHoles
designator *  value DC37_Receptacle_MountingHoles  Reference: J
ki_keywords: female receptacle D-SUB connector; ki_description: 37-pin female receptacle socket D-SUB connector, Mounting Hole; ki_fp_filters: DSUB*Female*; Datasheet: ~
pins: 0 PAD, 1, 2, 3, 4, 5, 6, 7, 8, 9, 10, 11, 12, 13, 14, 15, 16, 17, 18, 19, 20, 21, 22, 23, 24, 25, 26, 27, 28, 29, 30, 31, 32, 33, 34, 35, 36, 37

## DE9_Plug
designator *  value DE9_Plug  Reference: J
ki_keywords: connector male plug D-SUB DB9; ki_description: 9-pin male plug pin D-SUB connector; ki_fp_filters: DSUB*Male*; Datasheet: ~
pins: 1, 2, 3, 4, 5, 6, 7, 8, 9

## DE9_Plug_MountingHoles
designator *  value DE9_Plug_MountingHoles  Reference: J
ki_keywords: connector plug male D-SUB DB9; ki_description: 9-pin male plug pin D-SUB connector, Mounting Hole; ki_fp_filters: DSUB*Male*; Datasheet: ~
pins: 0 PAD, 1, 2, 3, 4, 5, 6, 7, 8, 9

## DE9_Receptacle
designator *  value DE9_Receptacle  Reference: J
ki_keywords: connector receptacle female D-SUB DB9; ki_description: 9-pin female receptacle socket D-SUB connector; ki_fp_filters: DSUB*Female*; Datasheet: ~
pins: 1, 2, 3, 4, 5, 6, 7, 8, 9

## DE9_Receptacle_MountingHoles
designator *  value DE9_Receptacle_MountingHoles  Reference: J
ki_keywords: connector receptacle female D-SUB DB9; ki_description: 9-pin female receptacle socket D-SUB connector, Mounting Hole; ki_fp_filters: DSUB*Female*; Datasheet: ~
pins: 0 PAD, 1, 2, 3, 4, 5, 6, 7, 8, 9

## DE15_Plug_HighDensity
designator *  value DE15_Plug_HighDensity  Reference: J
ki_keywords: connector plug male VGA D-SUB; ki_description: 15-pin male plug socket D-SUB connector, High density (3 columns), Triple Row, Generic, VGA-connector; ki_fp_filters: DSUB*Male*; Datasheet: ~
pins: 1, 2, 3, 4, 5, 6, 7, 8, 9, 10, 11, 12, 13, 14, 15

## DE15_Plug_HighDensity_MountingHoles
designator *  value DE15_Plug_HighDensity_MountingHoles  Reference: J
ki_keywords: connector plug male D-SUB VGA; ki_description: 15-pin male plug socket D-SUB connector, High density (3 columns), Triple Row, Generic, VGA-connector, Mounting Hole; ki_fp_filters: DSUB*Male*; Datasheet: ~
pins: 0, 1, 2, 3, 4, 5, 6, 7, 8, 9, 10, 11, 12, 13, 14, 15

## DE15_Receptacle_HighDensity
designator *  value DE15_Receptacle_HighDensity  Reference: J
ki_keywords: connector  receptacle de15 VGA female D-SUB; ki_description: 15-pin female receptacle socket D-SUB connector, High density (3 columns), Triple Row, Generic, VGA-connector; ki_fp_filters: DSUB*Female*; Datasheet: ~
pins: 1, 2, 3, 4, 5, 6, 7, 8, 9, 10, 11, 12, 13, 14, 15